# Altium footprint library micromouse pcb library.PcbLib: 68 footprints (part 5 of 5)
Each footprint in its own frame and in the unit in brackets; x right, y up, seen from the top. Pads: shape width x height; smd on the part's side, far side on the other; paste and mask are expansions set on the pad; w line width, h text height; cw(c..) or ccw(c..) is an arc to the next point about the centre after c.
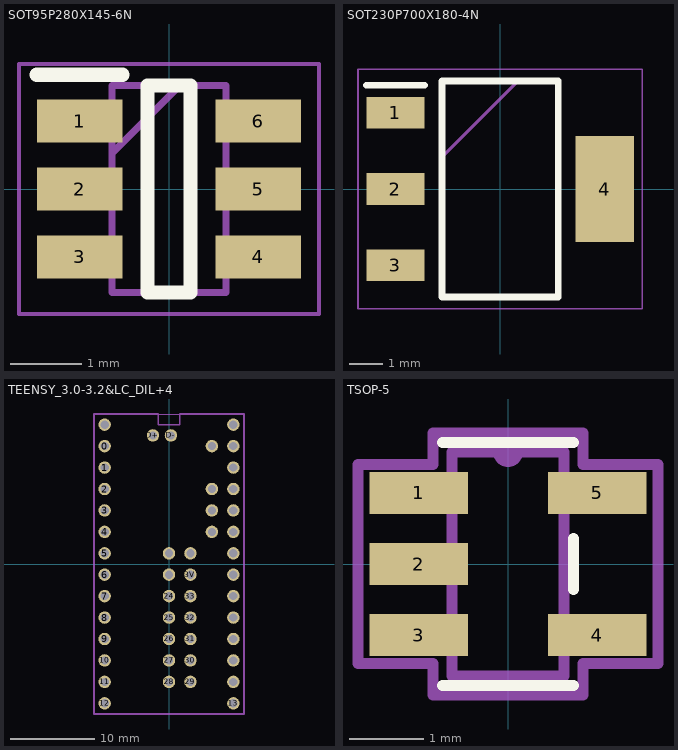
[diagram p4: the footprints below, top view; thin cyan lines are the x and y axes]

## SOT95P280X145-6N [mm]
pads (6):
  rect 1.2x0.6 smd: 1(-1.25,0.95) 2(-1.25,0) 3(-1.25,-0.95) 4(1.25,-0.95) 5(1.25,0) 6(1.25,0.95)
Top Overlay:
  lines w0.2: -1.85,1.6 -0.65,1.6 ; -0.3,-1.45 -0.3,1.45 0.3,1.45 0.3,-1.45 -0.3,-1.45
Mechanical 13:
  lines w0.1: -0.8,0.5 0.15,1.45 ; -0.8,-1.45 -0.8,1.45 0.8,1.45 0.8,-1.45 -0.8,-1.45
Mechanical 15:
  lines w0.05: -2.1,-1.75 -2.1,1.75 2.1,1.75 2.1,-1.75 -2.1,-1.75
3D body "MT3608.stp": height 1.45, standoff 0, extent -1.4,-1.45 1.4,1.45

## SOT230P700X180-4N [mm]
pads (4):
  rect 1.75x0.95 smd: 1(-3.15,2.3) 2(-3.15,0) 3(-3.15,-2.3)
  rect 1.75x3.2 smd: 4(3.15,0)
Top Overlay:
  lines w0.2: -4.025,3.125 -2.275,3.125 ; -1.75,-3.25 1.75,-3.25 1.75,3.25 -1.75,3.25 -1.75,-3.25
Mechanical 13:
  lines w0.1: -1.75,0.95 0.55,3.25 ; -1.75,-3.25 1.75,-3.25 1.75,3.25 -1.75,3.25 -1.75,-3.25
Mechanical 15:
  lines w0.05: -4.275,-3.6 4.275,-3.6 4.275,3.6 -4.275,3.6 -4.275,-3.6
3D body "LM7805MPX_NOPB.stp": height 1.8, standoff 0, extent -3.5,-3.25 3.5,3.25

## TEENSY_3.0-3.2&LC_DIL+4 [mil]
pads (48):
  round 58 / inner round 60 / far side round 58 hole 38: 0(-300,550) 1(-300,450) 2(-300,350) 3(-300,250) 3.3V(300,450) 4(-300,150) 5(-300,50) 6(-300,-50) 7(-300,-150) 8(-300,-250) 9(-300,-350) 10(-300,-450) 11(-300,-550) 12(-300,-650) 13(300,-650) 14/A0(300,-550) 15/A1(300,-450) 16/A2(300,-350) 17/A3(300,-250) 18/A4(300,-150) 19/A5(300,-50) 20/A6(300,50) 21/A7(300,150) 22/A8(300,250) 23/A9(300,350) A10(200,250) A11(200,150) AGND(300,550) AREF(200,350) GND(-300,650) VIN(300,650) VUSB(200,550)
  round 58 / inner round 60 / far side round 60 hole 38: 3V(100,-50) 24(0,-150) 25(0,-250) 26(0,-350) 27(0,-450) 28(0,-550) 29(100,-550) 30(100,-450) 31(100,-350) 32(100,-250) 33(100,-150) A12(0,50) A13(100,50) D+(-75,600) D-(9,600) GND(0,-50)
Mechanical 3:
  lines w5: -350,-700 350,-700 350,700 -350,700 -350,-700
Mechanical 7:
  lines w8: -350,-700 350,-700 350,700 50,700 50,650 -50,650 -50,700 -350,700 -350,-700
3D body "female_header_a-bl254-eg-g03d.stp": height 108.98, standoff -351.65, extent 149,94.08 247.43,403.92
3D body "Header, Male, 2.54mm, 1x3.STEP": height -118.78, standoff -573.11, extent 149,99 249,399
3D body "female_header_a-bl254-eg-g14d.stp": height 334.65, standoff -125.98, extent 251,-704 349.43,705.84
3D body "female_header_a-bl254-eg-g14d.stp": height 334.65, standoff -125.98, extent -350,-705.92 -251.57,703.92
3D body "Teensy_3-2.stp": height 607.87, standoff 356.26, extent -350.58,-701.68 353.14,754.99
3D body "Pogo_pin_P75-E2.stp": height 194.24, standoff -453, extent -100.58,574.42 -49.4,625.6
3D body "Pogo_pin_P75-E2.stp": height 194.24, standoff -453, extent -16.58,574.42 34.6,625.6
3D body "Header, Male, 2.54mm, 1x14.STEP": height 553.11, standoff 98.78, extent 249,-700 349,700
3D body "Header, Male, 2.54mm, 1x14.STEP": height 553.11, standoff 98.78, extent -351,-700 -251,700
3D body "female_header_a-bl254-eg-g05d.stp": height 125.98, standoff -334.65, extent 50.79,-604.92 149.22,-95.07
3D body "female_header_a-bl254-eg-g05d.stp": height 125.98, standoff -334.65, extent -49.21,-604.92 49.21,-95.07

## TSOP-5 [mil]
pads (5):
  rect 52x22 smd: 1(-47,37.4) 2(-47,0) 3(-47,-37.4) 4(47,-37.4) 5(47,37.4)
Top Overlay:
  lines w6: -34.5,-64 34.5,-64 ; -34.5,64 34.5,64 ; 34.5,-13.3 34.5,13.3
Mechanical 1:
  lines w1: -59,-47.4 -29.5,-47.4 -29.5,-27.4 -59,-27.4 -59,-47.4 ; -59,-10 -29.5,-10 -29.5,10 -59,10 -59,-10 ; -59,27.4 -29.5,27.4 -29.5,47.4 -59,47.4 -59,27.4 ; -29.5,-59 -29.5,59 29.5,59 29.5,-59 -29.5,-59 ; 29.5,-47.4 59,-47.4 59,-27.4 29.5,-27.4 29.5,-47.4 ; 29.5,27.4 59,27.4 59,47.4 29.5,47.4 29.5,27.4
Mechanical 16:
  lines w6: -4.92,59 ccw(c0,59) 4.92,59 ; -79,-52.4 -79,52.4 -39.5,52.4 -39.5,69 39.5,69 39.5,52.4 79,52.4 79,-52.4 39.5,-52.4 39.5,-69 -39.5,-69 -39.5,-52.4 -79,-52.4 ; -29.5,-59 29.5,-59 29.5,59 -29.5,59 -29.5,-59
3D body "TSOP-5.step": height 43.11, standoff 0, extent -59.01,-59.01 59.01,59.02